# Altium footprint library nucleof446re_conns.PcbLib: 11 footprints
Each footprint in its own frame and in the unit in brackets; x right, y up, seen from the top. Pads: shape width x height; smd on the part's side, far side on the other; paste and mask are expansions set on the pad; w line width, h text height; cw(c..) or ccw(c..) is an arc to the next point about the centre after c.
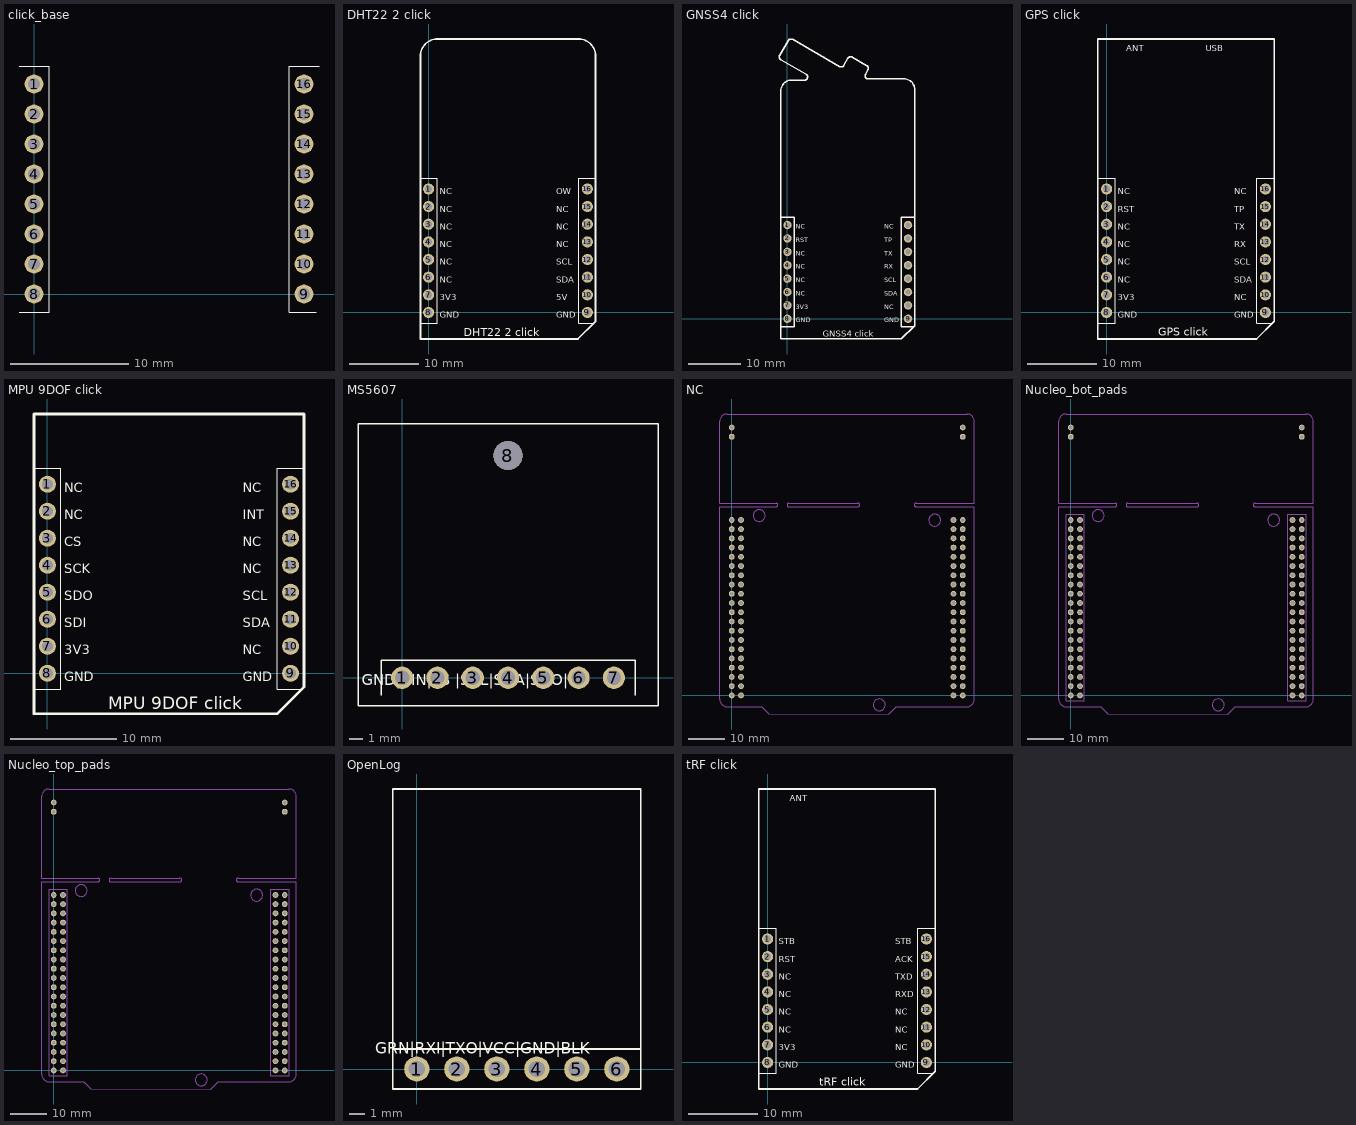
[diagram p0: the footprints below, top view; thin cyan lines are the x and y axes]

## click_base [mm] "base footprint w/o model"
pads (16):
  round 1.6 hole 1.02 unplated: 1(0,17.78) 2(0,15.24) 3(0,12.7) 4(0,10.16) 5(0,7.62) 6(0,5.08) 7(0,2.54) 8(0,0) 9(22.86,0) 10(22.86,2.54) 11(22.86,5.08) 12(22.86,7.62) 13(22.86,10.16) 14(22.86,12.7) 15(22.86,15.24) 16(22.86,17.78)
Top Overlay:
  lines w0.1: -1.27,-1.524 1.27,-1.524 1.27,19.304 -1.27,19.304 ; 23.876,-1.524 21.59,-1.524 21.59,19.304 24.13,19.304

## DHT22 2 click [mm] "DHT22 click footprint"
pads (16):
  round 1.6 hole 1.02 unplated: 1(0,17.78) 2(0,15.24) 3(0,12.7) 4(0,10.16) 5(0,7.62) 6(0,5.08) 7(0,2.54) 8(0,0) 9(22.86,0) 10(22.86,2.54) 11(22.86,5.08) 12(22.86,7.62) 13(22.86,10.16) 14(22.86,12.7) 15(22.86,15.24) 16(22.86,17.78)
Top Overlay:
  lines w0.1: -1.27,-1.524 1.27,-1.524 1.27,19.304 -1.27,19.304 ; 23.876,-1.524 21.59,-1.524 21.59,19.304 24.13,19.304
  lines w0.245: -1.18,-3.81 21.5,-3.81 24.04,-1.27 24.04,36.92 ccw(c21.59,36.92) 21.59,39.37 1.27,39.37 ccw(c1.27,36.92) -1.18,36.92 -1.18,-3.81
  text "NC" at 1.584,4.008 h1.5
  text "3V3" at 1.584,1.468 h1.5
  text "NC" at 1.584,11.628 h1.5
  text "NC" at 1.584,9.088 h1.5
  text "NC" at 1.584,16.708 h1.5
  text "GND" at 1.584,-1.072 h1.5
  text "NC" at 1.584,14.168 h1.5
  text "NC" at 1.584,6.548 h1.5
  text "SDA" at 18.364,4.008 h1.5
  text "5V" at 18.364,1.468 h1.5
  text "NC" at 18.364,11.628 h1.5
  text "NC" at 18.364,9.088 h1.5
  text "OW" at 18.364,16.708 h1.5
  text "GND" at 18.364,-1.072 h1.5
  text "NC" at 18.364,14.168 h1.5
  text "SCL" at 18.364,6.548 h1.5
  text "DHT22 2 click" at 5.08,-3.824 h2
3D body "DHT_sestava.stp": height 16.69, standoff -3.06, extent -1.275,-3.777 24.125,39.223

## GNSS4 click [mm]
pads (16):
  round 1.6 hole 1.02 unplated: 1(0,17.78) 2(0,15.24) 3(0,12.7) 4(0,10.16) 5(0,7.62) 6(0,5.08) 7(0,2.54) 8(0,0) 9(22.86,0) 10(22.86,2.54) 11(22.86,5.08) 12(22.86,7.62) 13(22.86,10.16) 14(22.86,12.7) 15(22.86,15.24) 16(22.86,17.78)
Top Overlay:
  lines w0.254: -1.475,49.948 ccw(c-0.955,49.648) -1.255,49.129 ; -1.475,49.953 0.148,52.764 ; -1.27,-1.524 1.27,-1.524 1.27,19.304 -1.27,19.304 ; -1.27,39.37 -1.27,-3.81 ; -1.254,49.129 -1.252,49.124 3.516,46.371 cw(c3.216,45.852) 3.216,45.254 0.75,45.254 ; -1.25,39.39 -1.25,43.25 cw(c0.75,43.25) 0.75,45.25 ; 0.148,52.759 cw(c0.668,52.459) 0.968,52.979 ; 0.968,52.983 9.874,47.842 ccw(c10.174,48.361) 10.693,48.061 11.466,49.4 cw(c11.986,49.1) 12.286,49.62 15.047,48.026 cw(c14.747,47.506) 15.267,47.206 14.801,46.4 ccw(c15.321,46.1) 15.321,45.5 22.125,45.5 cw(c22.125,43.5) 24.125,43.5 24.125,39.375 ; 20.73,-3.81 -1.27,-3.81 ; 23.876,-1.524 21.59,-1.524 21.59,19.304 24.13,19.304 ; 24.13,39.37 24.13,-1.27 21.59,-3.81 -1.27,-3.81
  text "GNSS4 click" at 6.7,-3.824 h2
  text "NC" at 1.584,4.008 h1.5
  text "3V3" at 1.584,1.468 h1.5
  text "NC" at 1.584,11.628 h1.5
  text "NC" at 1.584,9.088 h1.5
  text "NC" at 1.584,16.708 h1.5
  text "GND" at 1.584,-1.072 h1.5
  text "RST" at 1.584,14.168 h1.5
  text "NC" at 1.584,6.548 h1.5
  text "SDA" at 18.364,4.008 h1.5
  text "NC" at 18.364,1.468 h1.5
  text "TX" at 18.364,11.628 h1.5
  text "RX" at 18.364,9.088 h1.5
  text "NC" at 18.364,16.708 h1.5
  text "GND" at 18.364,-1.072 h1.5
  text "TP" at 18.364,14.168 h1.5
  text "SCL" at 18.364,6.548 h1.5
3D body "GNSS_sestava.stp": height 19.01, standoff -3.09, extent -1.36,-3.775 24.125,53.144

## GPS click [mm] "base footprint w/o model"
pads (16):
  round 1.6 hole 1.02 unplated: 1(0,17.78) 2(0,15.24) 3(0,12.7) 4(0,10.16) 5(0,7.62) 6(0,5.08) 7(0,2.54) 8(0,0) 9(22.86,0) 10(22.86,2.54) 11(22.86,5.08) 12(22.86,7.62) 13(22.86,10.16) 14(22.86,12.7) 15(22.86,15.24) 16(22.86,17.78)
Top Overlay:
  lines w0.1: -1.27,-1.524 1.27,-1.524 1.27,19.304 -1.27,19.304 ; 23.876,-1.524 21.59,-1.524 21.59,19.304 24.13,19.304
  lines w0.245: -1.27,39.37 -1.27,-3.81 21.59,-3.81 24.13,-1.27 24.13,39.37
  lines w0.254: -1.27,39.37 24.13,39.37
  text "USB" at 14.257,37.328 h1.5
  text "ANT" at 2.8,37.328 h1.5
  text "GPS click" at 7.434,-3.818 h2
  text "NC" at 1.584,4.008 h1.5
  text "3V3" at 1.584,1.468 h1.5
  text "NC" at 1.584,11.628 h1.5
  text "NC" at 1.584,9.088 h1.5
  text "NC" at 1.584,16.708 h1.5
  text "GND" at 1.584,-1.072 h1.5
  text "RST" at 1.584,14.168 h1.5
  text "NC" at 1.584,6.548 h1.5
  text "SDA" at 18.364,4.008 h1.5
  text "NC" at 18.364,1.468 h1.5
  text "TX" at 18.364,11.628 h1.5
  text "RX" at 18.364,9.088 h1.5
  text "NC" at 18.364,16.708 h1.5
  text "GND" at 18.364,-1.072 h1.5
  text "TP" at 18.364,14.168 h1.5
  text "SCL" at 18.364,6.548 h1.5
3D body "GPS_sestava.stp": height 22.56, standoff -3.09, extent -1.275,-3.775 24.125,43.725

## MPU 9DOF click [mm] "MPU9520 footprint"
pads (16):
  round 1.6 hole 1.02 unplated: 1(0,17.78) 2(0,15.24) 3(0,12.7) 4(0,10.16) 5(0,7.62) 6(0,5.08) 7(0,2.54) 8(0,0) 9(22.86,0) 10(22.86,2.54) 11(22.86,5.08) 12(22.86,7.62) 13(22.86,10.16) 14(22.86,12.7) 15(22.86,15.24) 16(22.86,17.78)
Top Overlay:
  lines w0.1: -1.27,-1.524 1.27,-1.524 1.27,19.304 -1.27,19.304 ; 23.876,-1.524 21.59,-1.524 21.59,19.304 24.13,19.304
  lines w0.245: -1.27,-3.81 21.59,-3.81 24.13,-1.27 24.13,24.384 -1.27,24.384 -1.27,-3.81
  text "MPU 9DOF click" at 5.715,-3.832 h2
  text "SDI" at 1.584,4.008 h1.5
  text "3V3" at 1.584,1.468 h1.5
  text "CS" at 1.584,11.628 h1.5
  text "SCK" at 1.584,9.088 h1.5
  text "NC" at 1.584,16.708 h1.5
  text "GND" at 1.584,-1.072 h1.5
  text "NC" at 1.584,14.168 h1.5
  text "SDO" at 1.584,6.548 h1.5
  text "SDA" at 18.364,4.008 h1.5
  text "NC" at 18.364,1.468 h1.5
  text "NC" at 18.364,11.628 h1.5
  text "NC" at 18.364,9.088 h1.5
  text "NC" at 18.364,16.708 h1.5
  text "GND" at 18.364,-1.072 h1.5
  text "INT" at 18.364,14.168 h1.5
  text "SCL" at 18.364,6.548 h1.5
3D body "MPU.stp": height 14.08, standoff -3.07, extent -1.27,-3.764 24.13,24.436

## MS5607 [mm]
pads (8):
  round 1.6 hole 1.02 unplated: 1(0,0) 2(2.54,0) 3(5.08,0) 4(7.62,0) 5(10.16,0) 6(12.7,0) 7(15.24,0)
  round 2.1 hole 2.1 unplated: 8(7.614,15.996)
Top Overlay:
  lines w0.1: -1.524,-1.27 -1.524,1.27 16.764,1.27 16.764,-1.27 ; -3.175,-2.032 18.415,-2.032 18.415,18.288 -3.175,18.288 -3.175,-2.032
  text "GND|VIN|PS |SCL|SDA|SDO|CS" at -2.917,-0.843 h1.35
Top Solder:
  circle w0.013: c7.614,15.996 r1.257
  lines w0.013: -3.181,-1.911 -3.181,18.409 18.409,18.409 18.409,-1.911 -3.181,-1.911
3D body "MS5607.stp": height 12.68, standoff -3.06, extent -3.175,-2.032 18.415,18.288

## NC [mm]
height 1
pads (80):
  round 1.6 hole 1.02 unplated: 1(0,45.72) 2(0,43.18) 3(0,40.64) 4(0,38.1) 5(0,35.56) 6(0,33.02) 7(0,30.48) 8(0,27.94) 9(0,25.4) 10(0,22.86) 11(0,20.32) 12(0,17.78) 13(0,15.24) 14(0,12.7) 15(0,10.16) 16(0,7.62) 17(0,5.08) 18(0,2.54) 19(0,0) 20(2.54,0) 21(2.54,2.54) 22(2.54,5.08) 23(2.54,7.62) 24(2.54,10.16) 25(2.54,12.7) 26(2.54,15.24) 27(2.54,17.78) 28(2.54,20.32) 29(2.54,22.86) 30(2.54,25.4) 31(2.54,27.94) 32(2.54,30.48) 33(2.54,33.02) 34(2.54,35.56) 35(2.54,38.1) 36(2.54,40.64) 37(2.54,43.18) 38(2.54,45.72) 39(60.96,45.72) 40(60.96,43.18) 41(60.96,40.64) 42(60.96,38.1) 43(60.96,35.56) 44(60.96,33.02) 45(60.96,30.48) 46(60.96,27.94) 47(60.96,25.4) 48(60.96,22.86) 49(60.96,20.32) 50(60.96,17.78) 51(60.96,15.24) 52(60.96,12.7) 53(60.96,10.16) 54(60.96,7.62) 55(60.96,5.08) 56(60.96,2.54) 57(60.96,0) 58(63.5,0) 59(63.5,2.54) 60(63.5,5.08) 61(63.5,7.62) 62(63.5,10.16) 63(63.5,12.7) 64(63.5,15.24) 65(63.5,17.78) 66(63.5,20.32) 67(63.5,22.86) 68(63.5,25.4) 69(63.5,27.94) 70(63.5,30.48) 71(63.5,33.02) 72(63.5,35.56) 73(63.5,38.1) 74(63.5,40.64) 75(63.5,43.18) 76(63.5,45.72) 77(0,71.12) 78(0,73.66) 79(63.5,71.12) 80(63.5,73.66)
via 63.5,48.26 diameter 1.6 hole 1.02
via 60.96,48.26 diameter 1.6 hole 1.02
via 2.54,48.26 diameter 1.6 hole 1.02
via 0,48.26 diameter 1.6 hole 1.02
Courtyard Bot:
  circle w0.013: c55.811,48.181 r1.636
  circle w0.013: c55.811,48.181 r1.636
  circle w0.013: c40.571,-2.619 r1.636
  circle w0.013: c40.571,-2.619 r1.636
  circle w0.013: c7.551,49.451 r1.636
  circle w0.013: c7.551,49.451 r1.636
  lines w0.013: -3.319,-1.119 ccw(c-1.319,-1.119) -1.319,-3.119 ; -3.319,-1.119 ccw(c-1.319,-1.119) -1.319,-3.119 ; -3.319,-1.119 -3.319,51.881 ; -3.319,-1.119 -3.319,51.881 ; -3.319,51.881 12.181,51.881 ; -3.319,51.881 12.181,51.881 ; -3.319,52.881 12.181,52.881 ; -3.319,52.881 12.181,52.881 ; -3.319,52.881 -3.319,75.381 ; -3.319,52.881 -3.319,75.381 ; -3.319,75.381 cw(c-1.319,75.381) -1.319,77.381 ; -3.319,75.381 cw(c-1.319,75.381) -1.319,77.381 ; -1.319,-3.119 8.181,-3.119 ; -1.319,-3.119 8.181,-3.119 ; -1.319,77.381 64.681,77.381 ; 8.181,-3.119 10.181,-5.119 ; 8.181,-3.119 10.181,-5.119 ; 10.181,-5.119 43.181,-5.119 ; 10.181,-5.119 43.181,-5.119 ; 12.181,51.881 ccw(c12.181,52.381) 12.181,52.881 ; 12.181,51.881 ccw(c12.181,52.381) 12.181,52.881 ; 15.681,52.881 ccw(c15.681,52.381) 15.681,51.881 34.681,51.881 ; 15.681,52.881 34.681,52.881 ; 15.681,52.881 34.681,52.881 ; 34.681,51.881 ccw(c34.681,52.381) 34.681,52.881 ; 34.681,51.881 ccw(c34.681,52.381) 34.681,52.881 ; 43.181,-5.119 45.181,-3.119 ; 43.181,-5.119 45.181,-3.119 ; 45.181,-3.119 64.681,-3.119 ; 45.181,-3.119 64.681,-3.119 ; 50.681,51.881 cw(c50.681,52.381) 50.681,52.881 ; 50.681,51.881 cw(c50.681,52.381) 50.681,52.881 ; 50.681,51.881 66.681,51.881 66.681,-1.119 ; 50.681,52.881 66.681,52.881 ; 50.681,52.881 66.681,52.881 ; 64.681,-3.119 ccw(c64.681,-1.119) 66.681,-1.119 ; 64.681,-3.119 ccw(c64.681,-1.119) 66.681,-1.119 ; 64.681,77.381 cw(c64.681,75.381) 66.681,75.381 ; 64.681,77.381 cw(c64.681,75.381) 66.681,75.381 ; 66.681,52.881 66.681,75.381 ; 66.681,52.881 66.681,75.381
3D body "NUCLEO-F411RE_upraveno.stp": height 1.5, standoff -22.18, extent -3.25,-5.065 66.75,78.9
3D body "61304021821 (rev1).stp": height 8.4, standoff -3.15, extent 59.685,-1.525 64.765,49.775
3D body "61304021821 (rev1).stp": height 8.4, standoff -3.15, extent -1.3,-1.525 3.78,49.775
3D body "61300211821 (rev1).stp": height 8.5, standoff -3.11, extent -1.25,69.6 1.25,75.18
3D body "61300211821 (rev1).stp": height 8.5, standoff -3.11, extent 62.25,69.6 64.75,75.18

## Nucleo_bot_pads [mm]
height 1
pads (80):
  round 1.6 hole 1.02 unplated: 1(0,45.72) 2(0,43.18) 3(0,40.64) 4(0,38.1) 5(0,35.56) 6(0,33.02) 7(0,30.48) 8(0,27.94) 9(0,25.4) 10(0,22.86) 11(0,20.32) 12(0,17.78) 13(0,15.24) 14(0,12.7) 15(0,10.16) 16(0,7.62) 17(0,5.08) 18(0,2.54) 19(0,0) 20(2.54,0) 21(2.54,2.54) 22(2.54,5.08) 23(2.54,7.62) 24(2.54,10.16) 25(2.54,12.7) 26(2.54,15.24) 27(2.54,17.78) 28(2.54,20.32) 29(2.54,22.86) 30(2.54,25.4) 31(2.54,27.94) 32(2.54,30.48) 33(2.54,33.02) 34(2.54,35.56) 35(2.54,38.1) 36(2.54,40.64) 37(2.54,43.18) 38(2.54,45.72) 39(60.96,45.72) 40(60.96,43.18) 41(60.96,40.64) 42(60.96,38.1) 43(60.96,35.56) 44(60.96,33.02) 45(60.96,30.48) 46(60.96,27.94) 47(60.96,25.4) 48(60.96,22.86) 49(60.96,20.32) 50(60.96,17.78) 51(60.96,15.24) 52(60.96,12.7) 53(60.96,10.16) 54(60.96,7.62) 55(60.96,5.08) 56(60.96,2.54) 57(60.96,0) 58(63.5,0) 59(63.5,2.54) 60(63.5,5.08) 61(63.5,7.62) 62(63.5,10.16) 63(63.5,12.7) 64(63.5,15.24) 65(63.5,17.78) 66(63.5,20.32) 67(63.5,22.86) 68(63.5,25.4) 69(63.5,27.94) 70(63.5,30.48) 71(63.5,33.02) 72(63.5,35.56) 73(63.5,38.1) 74(63.5,40.64) 75(63.5,43.18) 76(63.5,45.72) 77(0,71.12) 78(0,73.66) 79(63.5,71.12) 80(63.5,73.66)
via 0,48.26 diameter 1.6 hole 1.02
via 2.54,48.26 diameter 1.6 hole 1.02
via 60.96,48.26 diameter 1.6 hole 1.02
via 63.5,48.26 diameter 1.6 hole 1.02
Courtyard Top:
  lines w0.1: -1.25,-1.5 3.75,-1.5 3.75,49.75 -1.25,49.75 -1.25,-1.5 ; 59.71,-1.5 64.71,-1.5 64.71,49.75 59.71,49.75 59.71,-1.5
Courtyard Bot:
  circle w0.013: c7.551,49.451 r1.636
  circle w0.013: c7.551,49.451 r1.636
  circle w0.013: c40.571,-2.619 r1.636
  circle w0.013: c40.571,-2.619 r1.636
  circle w0.013: c55.811,48.181 r1.636
  circle w0.013: c55.811,48.181 r1.636
  lines w0.013: -3.319,-1.119 ccw(c-1.319,-1.119) -1.319,-3.119 ; -3.319,-1.119 ccw(c-1.319,-1.119) -1.319,-3.119 ; -3.319,-1.119 -3.319,51.881 ; -3.319,-1.119 -3.319,51.881 ; -3.319,51.881 12.181,51.881 ; -3.319,51.881 12.181,51.881 ; -3.319,52.881 -3.319,75.381 ; -3.319,52.881 -3.319,75.381 ; -3.319,52.881 12.181,52.881 ; -3.319,52.881 12.181,52.881 ; -3.319,75.381 cw(c-1.319,75.381) -1.319,77.381 ; -3.319,75.381 cw(c-1.319,75.381) -1.319,77.381 ; -1.319,-3.119 8.181,-3.119 ; -1.319,-3.119 8.181,-3.119 ; -1.319,77.381 64.681,77.381 ; 8.181,-3.119 10.181,-5.119 ; 8.181,-3.119 10.181,-5.119 ; 10.181,-5.119 43.181,-5.119 ; 10.181,-5.119 43.181,-5.119 ; 12.181,51.881 ccw(c12.181,52.381) 12.181,52.881 ; 12.181,51.881 ccw(c12.181,52.381) 12.181,52.881 ; 15.681,52.881 ccw(c15.681,52.381) 15.681,51.881 34.681,51.881 ; 15.681,52.881 34.681,52.881 ; 15.681,52.881 34.681,52.881 ; 34.681,51.881 ccw(c34.681,52.381) 34.681,52.881 ; 34.681,51.881 ccw(c34.681,52.381) 34.681,52.881 ; 43.181,-5.119 45.181,-3.119 ; 43.181,-5.119 45.181,-3.119 ; 45.181,-3.119 64.681,-3.119 ; 45.181,-3.119 64.681,-3.119 ; 50.681,51.881 cw(c50.681,52.381) 50.681,52.881 ; 50.681,51.881 cw(c50.681,52.381) 50.681,52.881 ; 50.681,51.881 66.681,51.881 66.681,-1.119 ; 50.681,52.881 66.681,52.881 ; 50.681,52.881 66.681,52.881 ; 64.681,-3.119 ccw(c64.681,-1.119) 66.681,-1.119 ; 64.681,-3.119 ccw(c64.681,-1.119) 66.681,-1.119 ; 64.681,77.381 cw(c64.681,75.381) 66.681,75.381 ; 64.681,77.381 cw(c64.681,75.381) 66.681,75.381 ; 66.681,52.881 66.681,75.381 ; 66.681,52.881 66.681,75.381
3D body "NUCLEO-F411RE_upraveno.stp": height 26.17, standoff -3.15, extent -3.25,-5.065 66.75,78.9

## Nucleo_top_pads [mm]
height 1
pads (80):
  round 1.6 hole 1.02 unplated: 1(0,45.72) 2(0,43.18) 3(0,40.64) 4(0,38.1) 5(0,35.56) 6(0,33.02) 7(0,30.48) 8(0,27.94) 9(0,25.4) 10(0,22.86) 11(0,20.32) 12(0,17.78) 13(0,15.24) 14(0,12.7) 15(0,10.16) 16(0,7.62) 17(0,5.08) 18(0,2.54) 19(0,0) 20(2.54,0) 21(2.54,2.54) 22(2.54,5.08) 23(2.54,7.62) 24(2.54,10.16) 25(2.54,12.7) 26(2.54,15.24) 27(2.54,17.78) 28(2.54,20.32) 29(2.54,22.86) 30(2.54,25.4) 31(2.54,27.94) 32(2.54,30.48) 33(2.54,33.02) 34(2.54,35.56) 35(2.54,38.1) 36(2.54,40.64) 37(2.54,43.18) 38(2.54,45.72) 39(60.96,45.72) 40(60.96,43.18) 41(60.96,40.64) 42(60.96,38.1) 43(60.96,35.56) 44(60.96,33.02) 45(60.96,30.48) 46(60.96,27.94) 47(60.96,25.4) 48(60.96,22.86) 49(60.96,20.32) 50(60.96,17.78) 51(60.96,15.24) 52(60.96,12.7) 53(60.96,10.16) 54(60.96,7.62) 55(60.96,5.08) 56(60.96,2.54) 57(60.96,0) 58(63.5,0) 59(63.5,2.54) 60(63.5,5.08) 61(63.5,7.62) 62(63.5,10.16) 63(63.5,12.7) 64(63.5,15.24) 65(63.5,17.78) 66(63.5,20.32) 67(63.5,22.86) 68(63.5,25.4) 69(63.5,27.94) 70(63.5,30.48) 71(63.5,33.02) 72(63.5,35.56) 73(63.5,38.1) 74(63.5,40.64) 75(63.5,43.18) 76(63.5,45.72) 77(0,71.12) 78(0,73.66) 79(63.5,71.12) 80(63.5,73.66)
via 0,48.26 diameter 1.6 hole 1.02
via 2.54,48.26 diameter 1.6 hole 1.02
via 60.96,48.26 diameter 1.6 hole 1.02
via 63.5,48.26 diameter 1.6 hole 1.02
Courtyard Top:
  lines w0.1: -1.25,-1.5 -1.25,49.75 3.75,49.75 3.75,-1.5 -1.25,-1.5 ; 59.71,-1.5 59.71,49.75 64.71,49.75 64.71,-1.5 59.71,-1.5
Courtyard Bot:
  circle w0.013: c7.551,49.451 r1.636
  circle w0.013: c7.551,49.451 r1.636
  circle w0.013: c40.571,-2.619 r1.636
  circle w0.013: c40.571,-2.619 r1.636
  circle w0.013: c55.811,48.181 r1.636
  circle w0.013: c55.811,48.181 r1.636
  lines w0.013: -3.319,-1.119 ccw(c-1.319,-1.119) -1.319,-3.119 ; -3.319,-1.119 ccw(c-1.319,-1.119) -1.319,-3.119 ; -3.319,-1.119 -3.319,51.881 ; -3.319,-1.119 -3.319,51.881 ; -3.319,51.881 12.181,51.881 ; -3.319,51.881 12.181,51.881 ; -3.319,52.881 -3.319,75.381 ; -3.319,52.881 -3.319,75.381 ; -3.319,52.881 12.181,52.881 ; -3.319,52.881 12.181,52.881 ; -3.319,75.381 cw(c-1.319,75.381) -1.319,77.381 ; -3.319,75.381 cw(c-1.319,75.381) -1.319,77.381 ; -1.319,-3.119 8.181,-3.119 ; -1.319,-3.119 8.181,-3.119 ; -1.319,77.381 64.681,77.381 ; 8.181,-3.119 10.181,-5.119 ; 8.181,-3.119 10.181,-5.119 ; 10.181,-5.119 43.181,-5.119 ; 10.181,-5.119 43.181,-5.119 ; 12.181,51.881 ccw(c12.181,52.381) 12.181,52.881 ; 12.181,51.881 ccw(c12.181,52.381) 12.181,52.881 ; 15.681,52.881 ccw(c15.681,52.381) 15.681,51.881 34.681,51.881 ; 15.681,52.881 34.681,52.881 ; 15.681,52.881 34.681,52.881 ; 34.681,51.881 ccw(c34.681,52.381) 34.681,52.881 ; 34.681,51.881 ccw(c34.681,52.381) 34.681,52.881 ; 43.181,-5.119 45.181,-3.119 ; 43.181,-5.119 45.181,-3.119 ; 45.181,-3.119 64.681,-3.119 ; 45.181,-3.119 64.681,-3.119 ; 50.681,51.881 cw(c50.681,52.381) 50.681,52.881 ; 50.681,51.881 cw(c50.681,52.381) 50.681,52.881 ; 50.681,51.881 66.681,51.881 66.681,-1.119 ; 50.681,52.881 66.681,52.881 ; 50.681,52.881 66.681,52.881 ; 64.681,-3.119 ccw(c64.681,-1.119) 66.681,-1.119 ; 64.681,-3.119 ccw(c64.681,-1.119) 66.681,-1.119 ; 64.681,77.381 cw(c64.681,75.381) 66.681,75.381 ; 64.681,77.381 cw(c64.681,75.381) 66.681,75.381 ; 66.681,52.881 66.681,75.381 ; 66.681,52.881 66.681,75.381
3D body "61300211821 (rev1).stp": height 8.5, standoff -3.11, extent 62.25,69.6 64.75,75.18
3D body "61300211821 (rev1).stp": height 8.5, standoff -3.11, extent -1.25,69.6 1.25,75.18
3D body "61304021821 (rev1).stp": height 8.41, standoff -3.14, extent -1.3,-1.525 3.78,49.775
3D body "61304021821 (rev1).stp": height 8.41, standoff -3.14, extent 59.685,-1.525 64.765,49.775
3D body "NUCLEO-F411RE_upraveno.stp": height 1.52, standoff -27.74, extent -3.25,-5.065 66.75,78.9

## OpenLog [mm]
pads (6):
  round 1.6 hole 1.02 unplated: 1(0,0) 2(2.54,0) 3(5.08,0) 4(7.62,0) 5(10.16,0) 6(12.7,0)
Top Overlay:
  lines w0.1: 14.224,1.27 -1.524,1.27 ; -1.524,1.27 -1.524,17.78 14.224,17.78 14.224,-1.27 -1.524,-1.27 -1.524,1.27
  text "GRN|RXI|TXO|VCC|GND|BLK" at -2.639,0.706 h1.25
3D body "openlog sestava.stp": height 14.53, standoff -3.07, extent -1.52,-1.27 14.22,17.78

## tRF click [mm] "base footprint w/o model"
pads (16):
  round 1.6 hole 1.02 unplated: 1(0,17.78) 2(0,15.24) 3(0,12.7) 4(0,10.16) 5(0,7.62) 6(0,5.08) 7(0,2.54) 8(0,0) 9(22.86,0) 10(22.86,2.54) 11(22.86,5.08) 12(22.86,7.62) 13(22.86,10.16) 14(22.86,12.7) 15(22.86,15.24) 16(22.86,17.78)
Top Overlay:
  lines w0.1: -1.27,-1.524 1.27,-1.524 1.27,19.304 -1.27,19.304 ; 23.876,-1.524 21.59,-1.524 21.59,19.304 24.13,19.304
  lines w0.245: -1.27,-3.81 -1.27,39.37 24.13,39.37 24.13,-1.27 21.59,-3.81 -1.27,-3.81
  text "NC" at 1.584,4.008 h1.5
  text "3V3" at 1.584,1.468 h1.5
  text "NC" at 1.584,11.628 h1.5
  text "NC" at 1.584,9.088 h1.5
  text "STB" at 1.584,16.708 h1.5
  text "GND" at 1.584,-1.072 h1.5
  text "RST" at 1.584,14.168 h1.5
  text "NC" at 1.584,6.548 h1.5
  text "NC" at 18.364,6.548 h1.5
  text "ACK" at 18.364,14.168 h1.5
  text "GND" at 18.364,-1.072 h1.5
  text "STB" at 18.364,16.708 h1.5
  text "RXD" at 18.364,9.088 h1.5
  text "TXD" at 18.364,11.628 h1.5
  text "NC" at 18.364,1.468 h1.5
  text "NC" at 18.364,4.008 h1.5
  text "tRF click" at 7.434,-3.818 h2
  text "ANT" at 3.2,37.328 h1.5
3D body "tRF sestava.stp": height 22.56, standoff -3.09, extent -1.27,-3.81 24.13,45.69